# Altium footprint library Elements_LT.PcbLib: 145 footprints (part 1 of 10)
Each footprint in its own frame and in the unit in brackets; x right, y up, seen from the top. Pads: shape width x height; smd on the part's side, far side on the other; paste and mask are expansions set on the pad; w line width, h text height; cw(c..) or ccw(c..) is an arc to the next point about the centre after c.
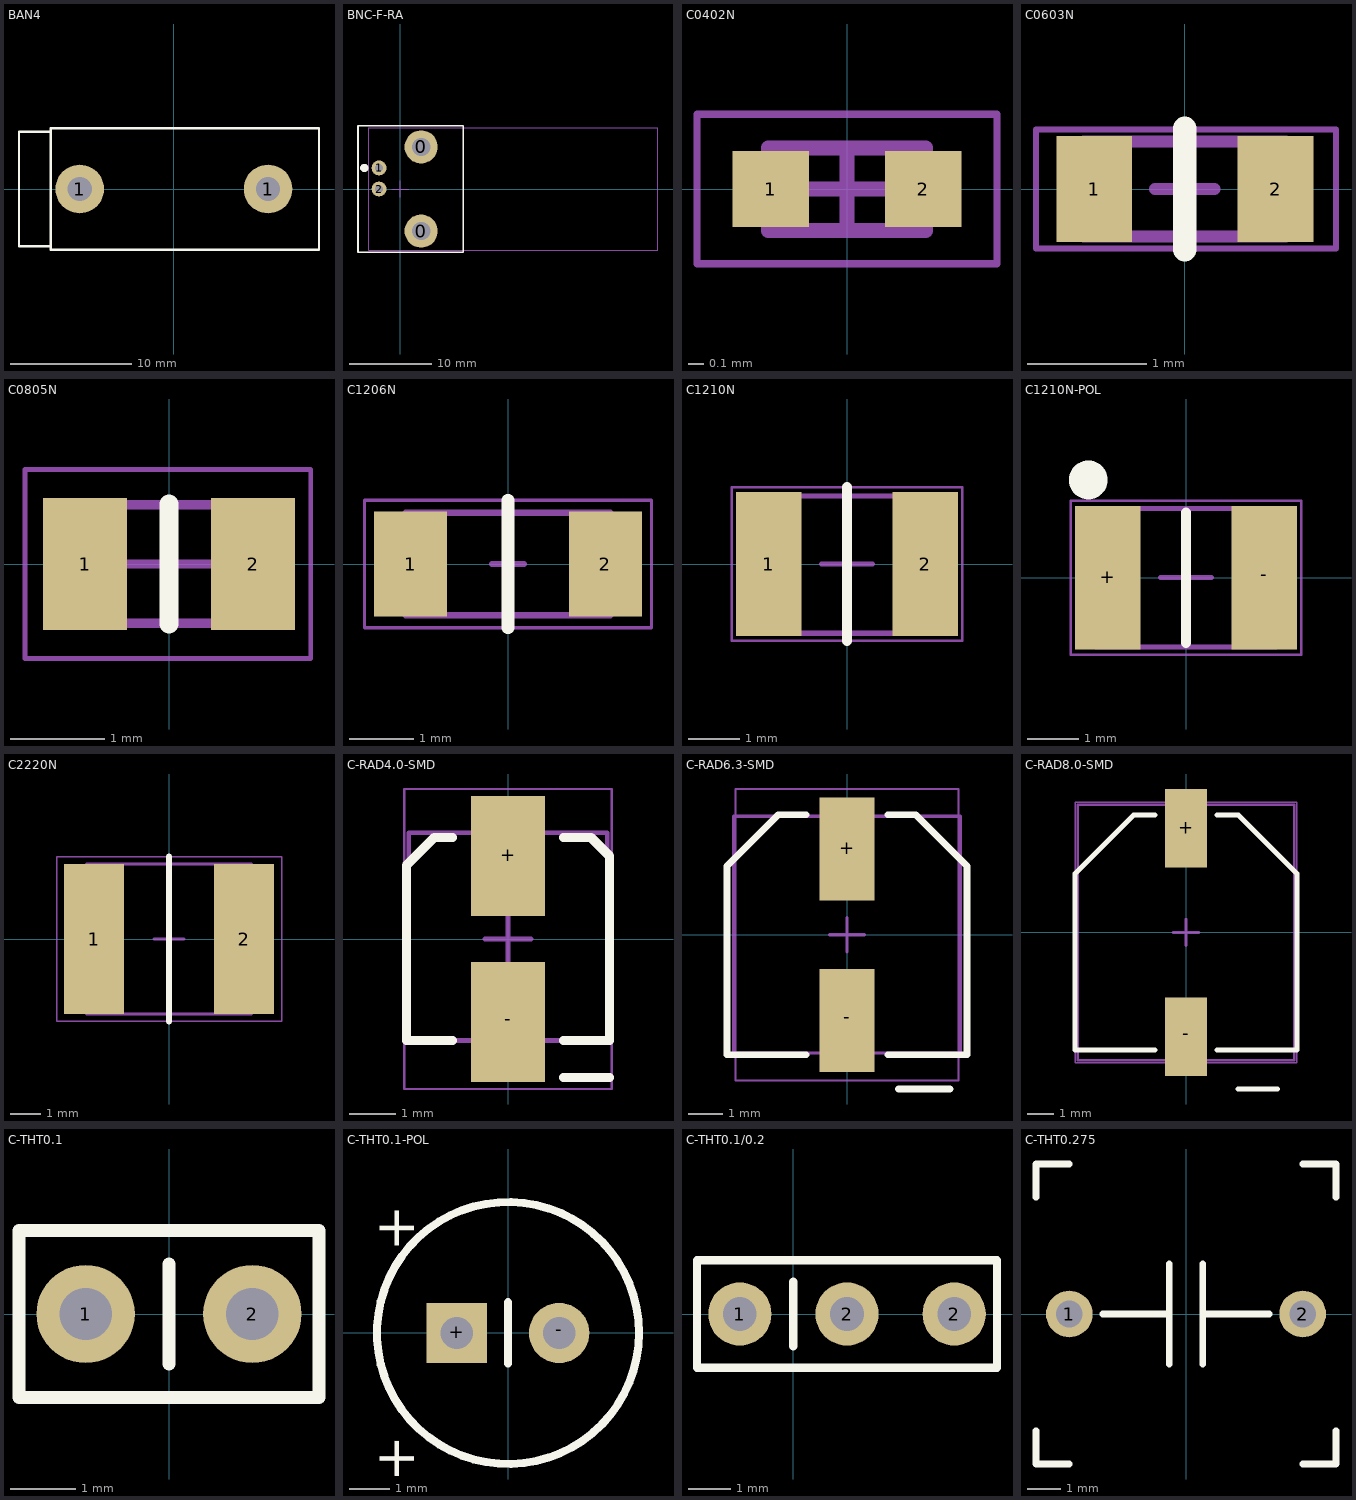
[diagram p0: the footprints below, top view; thin cyan lines are the x and y axes]

## BAN4 [mm] "Banana Jack; Receptable; 4mm"
height 13
pads (2):
  round 4 hole 2: 1(-7.75,0) 1(7.75,0)
Top Overlay:
  lines w0.2: -10.25,-4.7 -12.75,-4.7 -12.75,4.7 -10.15,4.7 ; -10.15,4.7 -10.15,4.7 ; -10.15,-5 11.941,-5 11.941,5 -10.15,5 -10.15,-5
3D body "banana_receptable.step": height 13.2, standoff -5.8, extent -12.678,-4.953 11.922,5.047

## BNC-F-RA [mm] "BNC Jack, Right Angled"
pads (4):
  round 4 hole 2.2: 0(2.54,-5.08) 0(2.54,5.08)
  round 1.8 hole 1: 1(-2.54,2.54) 2(-2.54,0)
Top Overlay:
  circle w1: c-4.318,2.54 r0.005
  lines w0.2: -5.08,-7.62 7.62,-7.62 7.62,7.62 -5.08,7.62 -5.08,-7.62
Mechanical 15:
  lines w0.05: -3.81,-7.366 -3.81,7.366 31.115,7.366 31.115,-7.366 -3.81,-7.366
  lines w0.1: -1.016,0 1.016,0 ; 0,-1.016 0,1.016
3D body "c-5227161-7-b-3d.stp": height 13.27, standoff -4.02, extent -3.797,-7.366 31.128,7.391

## C0402N [mil] "Capacitor, SMD, 0402 / 1005"
height 21.65
pads (2):
  rect 20x20 smd: 1(-20,0) 2(20,0)
Mechanical 13:
  lines w3.94: -20.67,-10.83 20.67,-10.83 20.67,10.83 -20.67,10.83 -20.67,-10.83
Mechanical 15:
  lines w1.97: -39.37,-19.68 39.37,-19.68 39.37,19.68 -39.37,19.68 -39.37,-19.68
  lines w3.94: -10.83,0 10.83,0 ; 0,-10.83 0,10.83
3D body "CAPC-0402-T0.55-BN.stp": height 21.65, standoff 0, extent -19.68,-9.84 21.65,11.81

## C0603N [mil] "Capacitor, SMD, 0603/ 1608"
height 23.62
pads (2):
  rect 25x35 smd: 1(-30,0) 2(30,0)
Top Overlay:
  lines w7.87: 0,-20 0,20
Mechanical 13:
  lines w3.94: -33.46,-15.74 -33.46,15.75 -29.53,15.75 33.46,15.75 33.46,-15.74 -33.46,-15.74
Mechanical 15:
  lines w1.97: -49.21,-19.68 -49.21,19.68 50,19.68 50,-19.68 -49.21,-19.68
  lines w3.94: -9.84,0 9.84,0 ; 0,-18.7 0,18.7
3D body "CAPC-0603-T0.9-BN.stp": height 35.43, standoff 0, extent -33.46,-17.71 33.47,17.72

## C0805N [mil] "Capacitor, SMD, 0805 / 2012"
height 39.37
pads (2):
  rect 35x55 smd: 1(-35,0) 2(35,0)
Top Overlay:
  lines w7.87: 0,-25 0,25
Mechanical 13:
  lines w3.94: -39.37,-24.6 39.37,-24.6 39.37,24.61 -39.37,24.61 -39.37,-24.6
Mechanical 15:
  lines w1.97: -60,-39.37 59.06,-39.37 59.06,39.37 -60,39.37 -60,-39.37
  lines w3.94: -19.68,0 19.69,0 ; 0,-19.68 0,19.68
3D body "CAPC-0805-T0.75-BN.stp": height 29.53, standoff 0, extent -41.34,-26.57 41.34,26.57

## C1206N [mil] "Capacitor, SMD, 1206 / 3216"
height 39.37
pads (2):
  rect 45x65 smd: 1(-60,0) 2(60,0)
Top Overlay:
  lines w7.87: 0,-39.37 0,39.37
Mechanical 13:
  lines w3.94: -62.99,-31.49 -62.99,31.5 63,31.5 63,-31.49 -62.99,-31.49
Mechanical 15:
  lines w1.97: -88.58,-39.37 -88.58,39.37 88.58,39.37 88.58,-39.37 -88.58,-39.37
  lines w3.94: -9.84,0 9.84,0 ; 0,-19.69 0,19.68 0,-19.68
3D body "CAPC-1206-T1.0-BN.stp": height 39.37, standoff 0, extent -65.94,-34.45 65.94,34.45

## C1210N [mm] "Chip Capacitor, 2-Leads, Body 3.30x2.50mm, IPC Medium Density"
height 2.3
pads (2):
  rect 1.27x2.8 smd: 1(-1.524,0) 2(1.524,0)
Top Overlay:
  lines w0.2: 0,-1.5 0,1.5
Mechanical 13:
  lines w0.1: -1.75,-1.35 1.75,-1.35 1.75,1.325 -1.75,1.325 -1.75,-1.35
Mechanical 15:
  lines w0.05: -2.25,-1.5 2.25,-1.5 2.25,1.5 -2.25,1.5 -2.25,-1.5
  lines w0.1: -0.5,0 0.5,0 ; 0,-0.5 0,0.5
3D body "CAPC-1210-T1.8-BN.stp": height 1.8, standoff 0, extent -1.75,-1.35 1.75,1.35

## C1210N-POL [mm] "Chip Capacitor, 2-Leads, Body 3.30x2.50mm, IPC Medium Density"
height 2.3
pads (2):
  rect 1.27x2.8 smd: +(-1.524,0) -(1.524,0)
Top Overlay:
  circle w0.5: c-1.905,1.905 r0.127
  lines w0.2: 0,-1.27 0,1.27
Mechanical 13:
  lines w0.1: -1.75,-1.35 -1.75,1.35 1.75,1.35 1.75,-1.35 -1.75,-1.35
Mechanical 15:
  lines w0.05: -2.25,-1.5 2.25,-1.5 2.25,1.5 -2.25,1.5 -2.25,-1.5
  lines w0.1: -0.5,0 0.5,0 ; 0,-0.5 0,0.5
3D body "CAPC-1210-T1.8-BN.stp": height 1.8, standoff 0, extent -1.75,-1.35 1.75,1.35

## C2220N [mm] "Chip Capacitor, 2-Leads, Body 6.0x5.0mm, IPC Medium Density"
height 4
pads (2):
  rect 2x5 smd: 1(-2.5,0) 2(2.5,0)
Top Overlay:
  lines w0.2: 0,-2.75 0,2.75
Mechanical 13:
  lines w0.1: -2.75,-2.5 2.75,-2.5 2.75,2.5 -2.75,2.5 -2.75,-2.5
Mechanical 15:
  lines w0.05: -3.75,-2.75 -3.75,2.75 3.75,2.75 3.75,-2.75 -3.75,-2.75
  lines w0.1: -0.5,0 0.5,0 ; 0,-0.5 0,0.5
3D body: height 5, standoff 0, extent -2.75,-2.5 2.75,2.5

## C-RAD4.0-SMD [mm] "Capacitor, Radial Can A5, SMD, Diameter 4.0mm"
height 5.5
pads (2):
  rect 1.6x2.6 smd: +(0,1.8) -(0,-1.8)
Top Overlay:
  lines w0.2: -1.2,-2.2 -2.2,-2.2 -2.2,1.6 -1.6,2.2 -1.2,2.2 ; 1.2,-3 2.2,-3 ; 1.2,-2.2 2.2,-2.2 2.2,1.8 1.8,2.2 1.2,2.2
Mechanical 13:
  lines w0.1: -2.15,-2.2 2.15,-2.2 2.15,2.3 -2.15,2.3 -2.15,-2.2
Mechanical 15:
  lines w0.05: -2.25,-3.25 -2.25,3.25 2.25,3.25 2.25,-3.25 -2.25,-3.25
  lines w0.1: -0.5,0 0.5,0 ; 0,-0.5 0,0.5
3D body "panasonic_b.stp": height 5.8, standoff 0, extent -2.15,-2.2 2.15,2.3

## C-RAD6.3-SMD [mm] "Capacitor, Radial Can C6, SMD, Diameter 6.3mm"
height 5.8
pads (2):
  rect 1.6x3 smd: +(0,2.5) -(0,-2.5)
Top Overlay:
  lines w0.2: -1.2,-3.5 -3.5,-3.5 -3.5,2 -2,3.5 -1.2,3.5 ; 1.2,-3.5 3.5,-3.5 3.5,-2.5 3.5,2 2,3.5 1.2,3.5 ; 1.5,-4.5 3,-4.5
Mechanical 13:
  lines w0.1: -3.3,-3.45 3.3,-3.45 3.3,3.45 -3.3,3.45 -3.3,-3.45
Mechanical 15:
  lines w0.05: -3.25,-4.25 -3.25,4.25 3.25,4.25 3.25,-4.25 -3.25,-4.25
  lines w0.1: -0.5,0 0.5,0 ; 0,-0.5 0,0.5
3D body "panasonic_d.stp": height 5.81, standoff 0, extent -3.3,-3.45 3.3,3.45

## C-RAD8.0-SMD [mm] "Capacitor, Radial Can F, SMD, Diameter 8.0mm"
height 7.7
pads (2):
  rect 1.6x3 smd: +(0,4) -(0,-4)
Top Overlay:
  lines w0.2: -1.2,-4.5 -4.25,-4.5 -4.25,2.25 -2,4.5 -1.2,4.5 ; 1.2,-4.5 4.25,-4.5 4.25,-1.75 4.25,2.25 2,4.5 1.2,4.5 ; 2,-6 3.5,-6
Mechanical 13:
  lines w0.1: -4.15,-4.9 -4.15,4.9 4.15,4.9 4.15,-4.9 -4.15,-4.9
Mechanical 15:
  lines w0.05: -4.25,-5 -4.25,5 4.25,5 4.25,-5 -4.25,-5
  lines w0.1: -0.5,0 0.5,0 ; 0,-0.5 0,0.5
3D body "panasonic_f.stp": height 10.21, standoff 0, extent -4.15,-4.9 4.15,4.9

## C-THT0.1 [mil] "Capacitor, THT, Pitch 100mil"
pads (2):
  round 59 hole 31.5: 1(-50,0) 2(50,0)
Top Overlay:
  lines w7.87: 0,-30 0,30 ; -90,-50 -90,50 90,50 90,-50 -90,-50
3D body "User Library-FK18X5R1E474K.STEP": height 255.8, standoff -91.77, extent -108.28,-49.21 108.28,49.21

## C-THT0.1-POL [mil] "Capacitor, THT, Pitch 100mil, Polarized"
pads (2):
  rect 59x59 hole 31.5: +(-50,0)
  round 59 hole 31.5: -(50,0)
Top Overlay:
  circle w7.87: c0,0 r127.95
  lines w7.87: 0,-30 0,30
  text "+" at -125,125 h40
  text "+" at -125,-100 h40
3D body: height 472.44, standoff 0, extent -127,-126.94 127,126.94

## C-THT0.1/0.2 [mil] "Capacitor, THT, Pitch 100mil"
pads (3):
  round 59 hole 31.5: 1(-50,0) 2(50,0) 2(150,0)
Top Overlay:
  lines w7.87: 0,-30 0,30 ; -90,-50 -90,50 190,50 190,-50 -90,-50
3D body "User Library-FK18X5R1E474K.STEP": height 255.8, standoff -91.77, extent -108.28,-49.21 108.28,49.21

## C-THT0.275 [mm] "Capacitor, THT, Radial, Pitch 7.5mm"
pads (2):
  round 1.4 hole 0.8: 1(-3.5,0) 2(3.5,0)
Top Overlay:
  lines w0.2: -4.5,-3.5 -4.5,-4.5 -3.5,-4.5 ; -4.5,3.5 -4.5,4.5 -3.5,4.5 ; -2.5,0 -0.5,0 ; -0.5,-1.5 -0.5,1.5 ; 0.5,-1.5 0.5,1.5 ; 0.5,0 2.5,0 ; 3.5,-4.5 4.5,-4.5 4.5,-3.5 ; 3.5,4.5 4.5,4.5 4.5,3.5